# Altium footprint library G02 Library.PcbLib: 15 footprints
Each footprint in its own frame and in the unit in brackets; x right, y up, seen from the top. Pads: shape width x height; smd on the part's side, far side on the other; paste and mask are expansions set on the pad; w line width, h text height; cw(c..) or ccw(c..) is an arc to the next point about the centre after c.
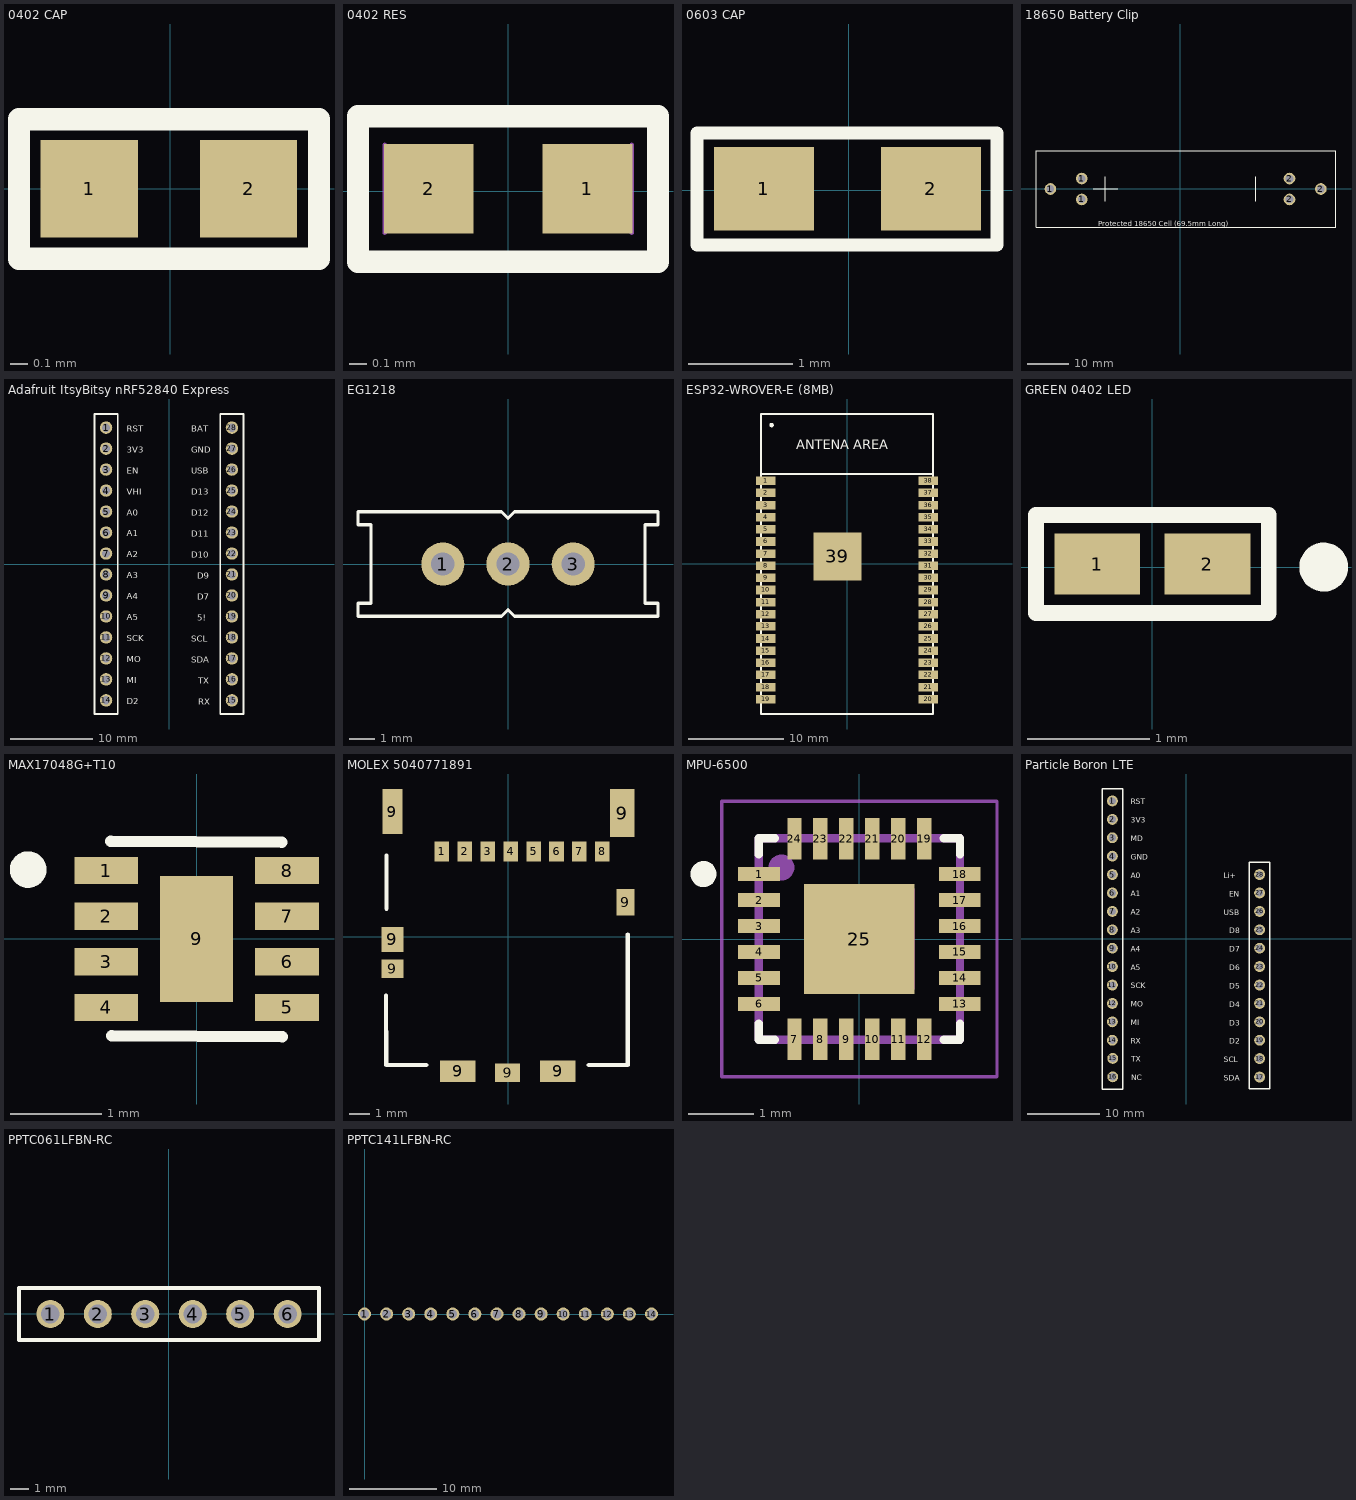
[diagram p0: the footprints below, top view; thin cyan lines are the x and y axes]

## 0402 CAP [mm]
pads (2):
  rect 0.55x0.55 smd mask+0.05: 1(-0.458,0) 2(0.442,0)
Top Overlay:
  lines w0.127: -0.855,-0.395 -0.855,0.393 -0.437,0.393 0.437,0.393 0.84,0.393 0.84,-0.395 -0.855,-0.395
3D body "Ceramic_Capacitor_0402_h20mil.step": height 0.52, standoff 0.01, extent -0.508,-0.245 0.508,0.263

## 0402 RES [mil]
pads (2):
  rect 20x20 smd: 1(17.74,0.51) 2(-17.7,0.51)
Top Overlay:
  lines w5: -33.46,-15.75 -33.46,16.73 33.46,16.73 33.46,-15.75 -33.46,-15.75
Bottom Assembly:
  lines w1: -27.54,-9.33 -27.54,10.35 ; 27.58,-9.33 27.58,10.35

## 0603 CAP [mm]
pads (2):
  rect 0.96x0.8 smd: 1(-0.813,0.013) 2(0.787,0.013)
Top Overlay:
  lines w0.127: -1.455,-0.525 1.42,-0.525 1.42,0.55 -1.455,0.55 -1.455,-0.525
3D body "User Library-0603 SMD Capacitor.step": height 0.3, standoff 0, extent -0.805,-0.38 0.795,0.42

## 18650 Battery Clip [mm]
pads (6):
  round 2.83 hole 1.83: 1(-31.62,-0.05) 1(-24,-2.59) 1(-24,2.49) 2(26.5,-2.59) 2(26.5,2.49) 2(34.12,-0.05)
Top Overlay:
  lines w0.254: -35.125,-9.35 35.125,-9.35 37.8,-9.35 37.8,1.925 37.8,9.25 -35.125,9.25 -35.125,-9.325 ; -21.25,-0.05 -15.25,-0.05 ; -18.25,-3.05 -18.25,2.95 ; 18.248,-3.045 18.248,2.955
  text "Protected 18650 Cell (69.5mm Long)" at -20,-9.05 h1.27
3D body "KEYELCO_54.STEP": height 18.16, standoff -3.05, extent 24.868,-9.5 37.875,9.387
3D body "Battery.step": height 19.5, standoff 1.3, extent -31.45,-9.025 34.55,9.164
3D body "KEYELCO_54.STEP": height 18.16, standoff -3.05, extent -35.195,-9.493 -22.188,9.394

## (WIP) Larger 18650 Holder [mm]
3D body "BK-18650-PC2.STEP": height 24.71, standoff 0, extent -39.855,-21.89 37.105,-0.91
3D body "Battery.step": height 24.1, standoff 5.9, extent -34.5,-21.575 31.5,-3.386

## Adafruit ItsyBitsy nRF52840 Express [mm] "Adafruit ItsyBitsy nRF52840 Express"
pads (28):
  round 1.5 hole 1: 1(-7.62,16.51) 2(-7.62,13.97) 3(-7.62,11.43) 4(-7.62,8.89) 5(-7.62,6.35) 6(-7.62,3.81) 7(-7.62,1.27) 8(-7.62,-1.27) 9(-7.62,-3.81) 10(-7.62,-6.35) 11(-7.62,-8.89) 12(-7.62,-11.43) 13(-7.62,-13.97) 14(-7.62,-16.51) 15(7.62,-16.51) 16(7.62,-13.97) 17(7.62,-11.43) 18(7.62,-8.89) 19(7.62,-6.35) 20(7.62,-3.81) 21(7.62,-1.27) 22(7.62,1.27) 23(7.62,3.81) 24(7.62,6.35) 25(7.62,8.89) 26(7.62,11.43) 27(7.62,13.97) 28(7.62,16.51)
Top Overlay:
  lines w0.2: -9.017,-18.161 -9.017,18.161 -6.223,18.161 -6.223,-18.161 -9.017,-18.161 ; 6.223,-18.161 6.223,18.161 9.017,18.161 9.017,-18.161 6.223,-18.161
  text "SDA" at 2.667,-11.938 h0.76
  text "SCL" at 2.667,-9.398 h0.76
  text "D9" at 3.429,-1.778 h0.76
  text "D10" at 2.667,0.762 h0.76
  text "D13" at 2.667,8.382 h0.76
  text "USB" at 2.667,10.922 h0.76
  text "TX" at 3.556,-14.478 h0.76
  text "RX" at 3.556,-17.018 h0.76
  text "D7" at 3.429,-4.318 h0.76
  text "5!" at 3.429,-6.858 h0.76
  text "D12" at 2.667,5.842 h0.76
  text "D11" at 2.667,3.302 h0.76
  text "GND" at 2.667,13.462 h0.76
  text "BAT" at 2.667,16.002 h0.76
  text "MO" at -5.098,-11.909 h0.76
  text "D2" at -5.098,-16.989 h0.76
  text "MI" at -5.098,-14.449 h0.76
  text "SCK" at -5.098,-9.369 h0.76
  text "A5" at -5.098,-6.829 h0.76
  text "A4" at -5.098,-4.289 h0.76
  text "A3" at -5.098,-1.749 h0.76
  text "A2" at -5.098,0.791 h0.76
  text "A1" at -5.098,3.331 h0.76
  text "A0" at -5.098,5.871 h0.76
  text "VHI" at -5.098,8.411 h0.76
  text "EN" at -5.098,10.951 h0.76
  text "3V3" at -5.098,13.491 h0.76
  text "RST" at -5.098,16.031 h0.76
3D body "_ _ _C141LFBN-RC.STEP": height 8.5, standoff -3.2, extent 6.35,-18.03 8.89,18.03
3D body "_ _ _C141LFBN-RC.STEP": height 8.5, standoff -3.2, extent -8.89,-18.03 -6.35,18.03
3D body "itsyBitsy nRF52840.step": height 12.89, standoff 7.15, extent -8.925,-17.833 8.855,18.383

## EG1218 [mil]
pads (3):
  round 66 hole 35.43: 1(-100,0) 2(0,0) 3(100,0)
Top Overlay:
  lines w5: -230,-80 -230,-60 -210,-60 -210,60 -230,60 -230,80 -10,80 0,70 10,80 230,80 230,60 210,60 210,-60 230,-60 230,-80 10,-80 0,-70 -10,-80 -230,-80
3D body "EG1218.stp": height 275.59, standoff -200.79, extent -228.35,-78.74 228.34,78.74

## ESP32-WROVER-E (8MB) [mm]
pads (39):
  rect 2x0.9 smd: 1(-8.5,8.66) 2(-8.5,7.39) 3(-8.5,6.12) 4(-8.5,4.85) 5(-8.5,3.58) 6(-8.5,2.31) 7(-8.5,1.04) 8(-8.5,-0.23) 9(-8.5,-1.5) 10(-8.5,-2.77) 11(-8.5,-4.04) 12(-8.5,-5.31) 13(-8.5,-6.58) 14(-8.5,-7.85) 15(-8.5,-9.12) 16(-8.5,-10.39) 17(-8.5,-11.66) 18(-8.5,-12.93) 19(-8.5,-14.2) 20(8.5,-14.2) 21(8.5,-12.93) 22(8.5,-11.66) 23(8.5,-10.39) 24(8.5,-9.12) 25(8.5,-7.85) 26(8.5,-6.58) 27(8.5,-5.31) 28(8.5,-4.04) 29(8.5,-2.77) 30(8.5,-1.5) 31(8.5,-0.23) 32(8.5,1.04) 33(8.5,2.31) 34(8.5,3.58) 35(8.5,4.85) 36(8.5,6.12) 37(8.5,7.39) 38(8.5,8.66)
  rect 5x5 smd: 39(-1,0.74)
Top Overlay:
  lines w0.2: -9,9.35 9,9.35 ; -9,-15.75 -9,15.65 9,15.65 9,-15.75 -9,-15.75
  lines w0.254: -7.808,14.542 ccw(c-7.893,14.49) -7.8,14.524
  text "ANTENA AREA" at -5.289,11.945 h1
3D body "ESP32-WROVER-B.STEP": height 3.3, standoff 0, extent -8.953,-15.743 9.047,15.657
3D body "ESP32-S2-WROVER.STEP": height 2.9, standoff -0.01, extent -8.247,-15.05 9.747,15.95

## GREEN 0402 LED [mm]
pads (2):
  rect 0.7x0.5 smd: 1(-0.45,0.025) 2(0.45,0.025)
Top Overlay:
  circle w0.2: c1.4,0 r0.1
  lines w0.127: -0.95,-0.375 0.95,-0.375 0.95,-0.187 0.95,0.425 -0.95,0.425 -0.95,-0.375
3D body "ChipLedWith-Green.stp": height 0.16, standoff 0, extent -0.502,-0.227 0.502,0.277

## MAX17048G+T10 [mm]
pads (9):
  rect 0.7x0.3 smd: 1(-0.99,0.75) 2(-0.99,0.25) 3(-0.99,-0.25) 4(-0.99,-0.75) 5(0.99,-0.75) 6(0.99,-0.25) 7(0.99,0.25) 8(0.99,0.75)
  rect 0.8x1.38 smd: 9(0,0)
Top Overlay:
  circle w0.2: c-1.845,0.76 r0.1
  lines w0.127: -0.94,1.07 0.93,1.06 ; -0.93,-1.06 0.94,-1.07
3D body: height 0.75, standoff 0, extent -1,-1 1,1

## MOLEX 5040771891 [mm]
pads (16):
  rect 0.7x0.95 smd: 1(-3.195,4.1) 2(-2.095,4.1) 3(-0.995,4.1) 4(0.105,4.1) 5(1.205,4.1) 6(2.305,4.1) 7(3.405,4.1) 8(4.505,4.1)
  rect 0.95x2.17 smd: 9(-5.57,6.01)
  rect 1.05x0.9 smd: 9(-5.565,-1.525)
  rect 1.05x1.2 smd: 9(-5.565,-0.115)
  rect 1.7x1.03 smd: 9(-2.44,-6.45) 9(2.36,-6.45)
  rect 1.2x0.88 smd: 9(-0.04,-6.525)
  rect 1.19x2.3 smd: 9(5.46,5.935)
  rect 0.88x1.25 smd: 9(5.615,1.66)
Top Overlay:
  lines w0.2: -5.87,-2.81 -5.865,-6.15 -3.945,-6.15 ; -5.86,1.345 -5.86,3.9 ; 3.855,-6.15 5.72,-6.15 5.72,0.11
3D body "5040771891.stp": height 1.26, standoff -0.02, extent -5.76,-6.65 5.62,6.85

## MPU-6500 [mm]
pads (25):
  rect 0.64x0.22 smd: 1(-1.545,1) 2(-1.545,0.6) 3(-1.545,0.2) 4(-1.545,-0.2) 5(-1.545,-0.6) 6(-1.545,-1) 13(1.545,-1) 14(1.545,-0.6) 15(1.545,-0.2) 16(1.545,0.2) 17(1.545,0.6) 18(1.545,1)
  rect 0.22x0.64 smd: 7(-1,-1.545) 8(-0.6,-1.545) 9(-0.2,-1.545) 10(0.2,-1.545) 11(0.6,-1.545) 12(1,-1.545) 19(1,1.545) 20(0.6,1.545) 21(0.2,1.545) 22(-0.2,1.545) 23(-0.6,1.545) 24(-1,1.545)
  rect 1.7x1.7 smd: 25(0,0)
Top Overlay:
  circle w0.2: c-2.4,1 r0.1
  lines w0.127: -1.55,-1.3 -1.55,-1.55 -1.3,-1.55 ; -1.55,1.3 -1.55,1.55 -1.3,1.55 ; 1.3,-1.55 1.55,-1.55 1.55,-1.3 ; 1.3,1.55 1.55,1.55 1.55,1.3
Keep-Out Layer:
  region: 0.85,-0.77 -0.85,-0.77 -0.85,0.77 0.85,0.77
  region: 0.85,-0.77 -0.85,-0.77 -0.85,0.77 0.85,0.77
Mechanical 13:
  circle w0.2: c-1.2,1.1 r0.1
  lines w0.127: -1.55,-1.55 1.55,-1.55 1.55,1.55 -1.55,1.55 -1.55,-1.55
Mechanical 15:
  lines w0.05: -2.12,-2.12 2.12,-2.12 2.12,2.12 -2.12,2.12 -2.12,-2.12
3D body: height 0.9, standoff 0, extent -1.5,-1.5 1.5,1.5

## Particle Boron LTE [mm]
pads (28):
  round 1.5 hole 1: 1(-10.16,19.05) 2(-10.16,16.51) 3(-10.16,13.97) 4(-10.16,11.43) 5(-10.16,8.89) 6(-10.16,6.35) 7(-10.16,3.81) 8(-10.16,1.27) 9(-10.16,-1.27) 10(-10.16,-3.81) 11(-10.16,-6.35) 12(-10.16,-8.89) 13(-10.16,-11.43) 14(-10.16,-13.97) 15(-10.11,-16.485) 16(-10.11,-19.025) 17(10.16,-19.05) 18(10.16,-16.51) 19(10.16,-13.97) 20(10.16,-11.43) 21(10.16,-8.89) 22(10.16,-6.35) 23(10.16,-3.81) 24(10.16,-1.27) 25(10.16,1.27) 26(10.16,3.81) 27(10.16,6.35) 28(10.16,8.89)
Top Overlay:
  lines w0.2: -11.557,-20.701 -8.763,-20.701 -8.763,20.701 -11.557,20.701 -11.557,-20.701 ; 8.763,-20.701 8.763,10.566 11.557,10.566 11.557,-20.701 8.763,-20.701
  text "EN" at 5.969,5.842 h0.76
  text "USB" at 5.207,3.302 h0.76
  text "D8" at 5.969,0.762 h0.76
  text "D7" at 5.969,-1.778 h0.76
  text "D3" at 5.969,-11.938 h0.76
  text "D2" at 5.969,-14.478 h0.76
  text "SDA" at 5.207,-19.558 h0.76
  text "SCL" at 5.207,-17.018 h0.76
  text "D6" at 5.969,-4.318 h0.76
  text "Li+" at 5.207,8.382 h0.76
  text "D4" at 5.969,-9.398 h0.76
  text "D5" at 5.969,-6.858 h0.76
  text "NC" at -7.588,-19.504 h0.76
  text "TX" at -7.588,-16.964 h0.76
  text "MO" at -7.638,-9.369 h0.76
  text "RX" at -7.638,-14.449 h0.76
  text "MI" at -7.638,-11.909 h0.76
  text "SCK" at -7.638,-6.829 h0.76
  text "A5" at -7.638,-4.289 h0.76
  text "A4" at -7.638,-1.749 h0.76
  text "A3" at -7.638,0.791 h0.76
  text "A2" at -7.638,3.331 h0.76
  text "A1" at -7.638,5.871 h0.76
  text "A0" at -7.638,8.411 h0.76
  text "GND" at -7.638,10.951 h0.76
  text "MD" at -7.638,13.491 h0.76
  text "3V3" at -7.638,16.031 h0.76
  text "RST" at -7.638,18.571 h0.76
3D body "Female Pin Header 01x16 Pitch 2.54mm Height 8.5mm.stp": height 8.5, standoff -3.2, extent -11.42,-20.32 -8.88,20.32
3D body "Female Pin Header 01x12 Pitch 2.54mm Height 8.5mm.stp": height 8.5, standoff -3.2, extent 8.88,-20.27 11.42,10.21
3D body "boron-v1.step": height 18.42, standoff 2.21, extent -11.43,-25.428 11.43,26

## PPTC061LFBN-RC [mm]
pads (6):
  round 1.5 hole 1: 1(-6.325,-0.025) 2(-3.785,-0.025) 3(-1.245,-0.025) 4(1.295,-0.025) 5(3.835,-0.025) 6(6.375,-0.025)
Top Overlay:
  lines w0.2: -8.001,-1.422 8.051,-1.422 8.051,1.372 -8.001,1.372 -8.001,-1.422
3D body "Female Pin Header 01x06 Pitch 2.54mm Height 8.5mm.stp": height 8.5, standoff -3.2, extent -7.595,-1.295 7.645,1.245

## PPTC141LFBN-RC [mm] "PPTC141LFBN-RC"
pads (14):
  round 1.5 hole 1: 1(0,0) 2(2.54,0) 3(5.08,0) 4(7.62,0) 5(10.16,0) 6(12.7,0) 7(15.24,0) 8(17.78,0) 9(20.32,0) 10(22.86,0) 11(25.4,0) 12(27.94,0) 13(30.48,0) 14(33.02,0)
3D body "_ _ _C141LFBN-RC.STEP": height 8.5, standoff -3.2, extent -1.52,-1.27 34.54,1.27